# Altium footprint library 04.连接器件.pcb.PCBLIB: 363 footprints (part 16 of 23)
Each footprint in its own frame and in the unit in brackets; x right, y up, seen from the top. Pads: shape width x height; smd on the part's side, far side on the other; paste and mask are expansions set on the pad; w line width, h text height; cw(c..) or ccw(c..) is an arc to the next point about the centre after c.
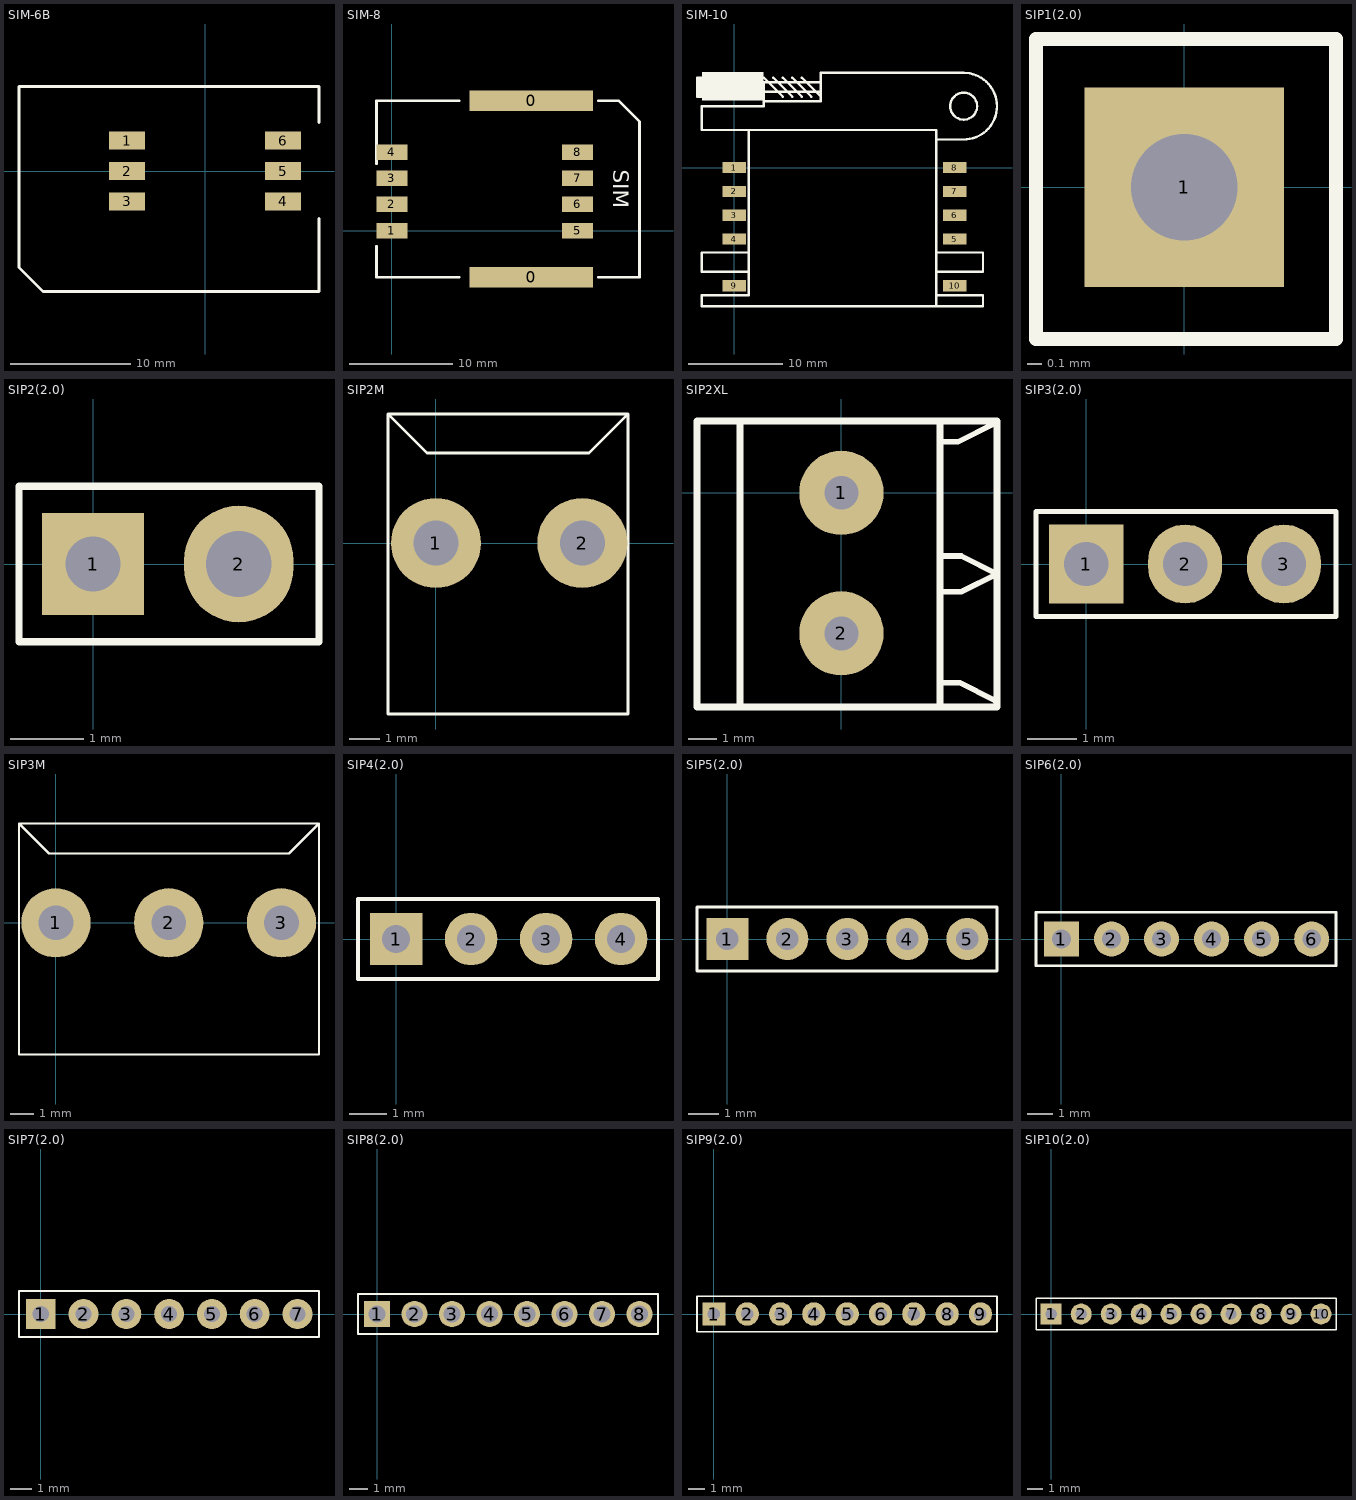
[diagram p15: the footprints below, top view; thin cyan lines are the x and y axes]

## SIM-6B [mm]
pads (6):
  rect 3x1.5 smd: 1(-6.5,2.54) 2(-6.5,0) 3(-6.5,-2.54) 4(6.5,-2.54) 5(6.5,0) 6(6.5,2.54)
TopOverlay:
  lines w0.254: 9.5,-3.96 9.5,-10.04 -13.5,-10.04 -15.5,-8.04 -15.5,7.04 9.5,7.04 9.5,4.04

## SIM-8 [mm]
pads (10):
  rect 12x2 smd: 0(13.5,-4.5) 0(13.5,12.58)
  rect 3x1.5 smd: 1(0,0) 2(0,2.54) 3(0,5.08) 4(0,7.62) 5(18,0) 6(18,2.54) 7(18,5.08) 8(18,7.62)
TopOverlay:
  lines w0.254: -1.5,-1.5 -1.5,-4.5 6.5,-4.5 ; -1.5,6.5 -1.5,12.58 6.5,12.58 ; 20,12.58 22,12.58 24,10.58 24,-4.5 20.016,-4.5
  text "SIM" at 21.446,5.91 h1.52

## SIM-10 [mm]
pads (10):
  rect 2.5x1.2 smd: 1(0,0) 2(0,-2.54) 3(0,-5.08) 4(0,-7.62) 5(23.5,-7.62) 6(23.5,-5.08) 7(23.5,-2.54) 8(23.5,0) 9(0,-12.6) 10(23.5,-12.6)
TopOverlay:
  circle w0.254: c24.464,6.552 r1.437
  rectangle: -3.476,7.168 3.128,10.216
  rectangle: -3.984,7.568 -3.476,9.6
  lines w0.254: -3.476,7.568 -3.984,7.568 -3.984,9.6 -3.476,9.6 ; 1.524,-11.096 -3.476,-11.096 -3.476,-9.064 1.524,-9.064 ; 1.524,4.012 1.524,-13.636 -3.476,-13.636 -3.476,-14.784 21.524,-14.784 ; 3.128,9.6 5.16,7.568 ; 4.144,9.6 6.176,7.568 ; 5.16,9.6 7.192,7.568 ; 6.176,9.6 8.208,7.568 ; 7.192,9.6 9.224,7.568 ; 9.224,8.076 3.128,8.076 3.128,7.06 9.224,7.06 9.224,10.108 24.464,10.108 cw(c24.464,6.552) 24.464,2.996 21.524,2.996 ; 9.224,9.092 3.128,9.092 3.128,6.552 -3.476,6.552 -3.476,4.012 21.524,4.012 21.524,-14.784 ; 21.524,-13.636 26.524,-13.636 26.524,-14.784 21.524,-14.784 ; 21.524,-11.096 26.524,-11.096 26.524,-9.064 21.524,-9.064
3D body "KF-016 SIM卡座.": height 3, standoff 0, extent -4.164,-14.91 27.836,10.09

## SIP1(2.0) [mm] "单排针"
pads (1):
  rect 1.4x1.4 hole 0.75: 1(0,0)
TopOverlay:
  lines w0.1: -1.041,-1.067 -1.041,1.041 1.067,1.041 1.067,-1.067 -1.041,-1.067
3D body "SIP1(2.0)排针.": height 8, standoff -2.6, extent -0.991,-1.016 1.009,0.984

## SIP2(2.0) [mm] "单排针"
pads (2):
  rect 1.4x1.4 hole 0.75: 1(0,0)
  oval 1.5x1.6 hole 0.9: 2(2,0)
TopOverlay:
  lines w0.1: -1.016,-1.067 3.099,-1.067 3.099,1.067 -1.016,1.067 -1.016,-1.067
3D body "SIP2(2.0)排针.": height 8, standoff -2.6, extent -0.952,-1 3.048,1

## SIP2M [mm]
pads (2):
  round 3 hole 1.5: 1(0,0) 2(4.877,0)
TopOverlay:
  lines w0.1: -1.6,4.3 6.4,4.3 ; -1.6,4.3 -1.6,-5.7 6.4,-5.7 6.4,4.3 ; -1.6,4.3 -0.3,3 5.1,3 6.4,4.3

## SIP2XL [mm]
pads (2):
  round 3 hole 1.2: 1(0,0) 2(0,-5)
TopOverlay:
  lines w0.203: 3.5,1.812 4.135,1.812 5.405,2.447 ; 3.559,-6.75 4.194,-6.75 5.464,-7.385 ; 3.623,-3.52 4.258,-3.52 5.528,-2.885 4.258,-2.25 3.623,-2.25
  lines w0.254: -3.612,-7.612 -3.612,2.548 ; 3.5,-7.612 3.5,2.548 ; -5.136,-7.612 5.532,-7.612 5.532,2.548 -5.136,2.548 -5.136,-7.612

## SIP3(2.0) [mm] "单排针"
pads (3):
  rect 1.5x1.6 hole 0.9: 1(0,0)
  oval 1.5x1.6 hole 0.9: 2(2,0) 3(4,0)
TopOverlay:
  lines w0.1: -1.016,-1.067 -1.016,1.067 5.055,1.067 5.055,-1.067 -1.016,-1.067
3D body "SIP3(2.0)排针.": height 8, standoff -2.6, extent -0.993,-0.965 5.007,1.035

## SIP3M [mm]
pads (3):
  round 3 hole 1.5: 1(0,0) 2(4.877,0) 3(9.754,0)
TopOverlay:
  lines w0.1: -1.6,4.3 11.377,4.3 ; -1.6,4.3 -1.6,-5.7 11.377,-5.7 11.377,4.3 ; -1.6,4.3 -0.3,3 10.077,3 11.377,4.3

## SIP4(2.0) [mm] "单排针"
pads (4):
  rect 1.4x1.4 hole 0.75: 1(0,0)
  round 1.4 hole 0.75: 2(2,0) 3(4,0) 4(6,0)
TopOverlay:
  lines w0.1: -1.016,-1.067 6.985,-1.067 6.985,1.067 -1.016,1.067 -1.016,-1.067
3D body "SIP4(2.0)排针.": height 8, standoff -2.6, extent -0.991,-1.016 7.009,0.984

## SIP5(2.0) [mm] "单排针"
pads (5):
  rect 1.4x1.4 hole 0.75: 1(0,0)
  round 1.4 hole 0.75: 2(2,0) 3(4,0) 4(6,0) 5(8,0)
TopOverlay:
  lines w0.1: -1.016,-1.067 8.992,-1.067 8.992,1.067 -1.016,1.067 -1.016,-1.067
3D body "SIP5(2.0)排针.": height 8, standoff -2.6, extent -0.991,-1.016 9.009,0.984

## SIP6(2.0) [mm] "单排针"
pads (6):
  rect 1.4x1.4 hole 0.75: 1(0,0)
  round 1.4 hole 0.75: 2(2,0) 3(4,0) 4(6,0) 5(8,0) 6(10,0)
TopOverlay:
  lines w0.1: -1.016,-1.067 10.973,-1.067 10.973,1.067 -1.016,1.067 -1.016,-1.067
3D body "SIP6(2.0)排针.": height 8, standoff -2.6, extent -0.991,-1.016 11.009,0.984

## SIP7(2.0) [mm] "单排针"
pads (7):
  rect 1.4x1.4 hole 0.75: 1(0,0)
  round 1.4 hole 0.75: 2(2,0) 3(4,0) 4(6,0) 5(8,0) 6(10,0) 7(12,0)
TopOverlay:
  lines w0.1: -1.016,-1.067 13.005,-1.067 13.005,1.067 -1.016,1.067 -1.016,-1.067
3D body "SIP7(2.0)排针.": height 8, standoff -2.6, extent -0.991,-1.016 13.009,0.984

## SIP8(2.0) [mm] "单排针"
pads (8):
  rect 1.4x1.4 hole 0.9: 1(0,0)
  round 1.4 hole 0.9: 2(2,0) 3(4,0) 4(6,0) 5(8,0) 6(10,0) 7(12,0) 8(14,0)
TopOverlay:
  lines w0.1: -1.016,-1.067 -1.016,1.067 14.986,1.067 14.986,-1.067 -1.016,-1.067
3D body "SIP8(2.0)排针.": height 8, standoff -2.6, extent -1.016,-1.016 14.984,0.984

## SIP9(2.0) [mm] "单排针"
pads (9):
  rect 1.4x1.4 hole 0.75: 1(0,0)
  round 1.4 hole 0.75: 2(2,0) 3(4,0) 4(6,0) 5(8,0) 6(10,0) 7(12,0) 8(14,0) 9(16,0)
TopOverlay:
  lines w0.1: -1.016,-1.067 16.993,-1.067 16.993,1.067 -1.016,1.067 -1.016,-1.067
3D body "SIP9(2.0)排针.": height 8, standoff -2.6, extent -0.991,-1.016 17.009,0.984

## SIP10(2.0) [mm] "单排针"
pads (10):
  rect 1.4x1.4 hole 0.75: 1(0,0)
  round 1.4 hole 0.75: 2(2,0) 3(4,0) 4(6,0) 5(8,0) 6(10,0) 7(12,0) 8(14,0) 9(16,0) 10(18,0)
TopOverlay:
  lines w0.1: -1.016,-1.067 -1.016,1.067 18.999,1.067 18.999,-1.067 -1.016,-1.067
3D body "SIP10(2.0)排针.": height 8, standoff -2.6, extent -0.991,-0.991 19.009,1.009